# Altium footprint library ICs And Semiconductors THD.PcbLib: 507 footprints (part 23 of 32)
Each footprint in its own frame and in the unit in brackets; x right, y up, seen from the top. Pads: shape width x height; smd on the part's side, far side on the other; paste and mask are expansions set on the pad; w line width, h text height; cw(c..) or ccw(c..) is an arc to the next point about the centre after c.
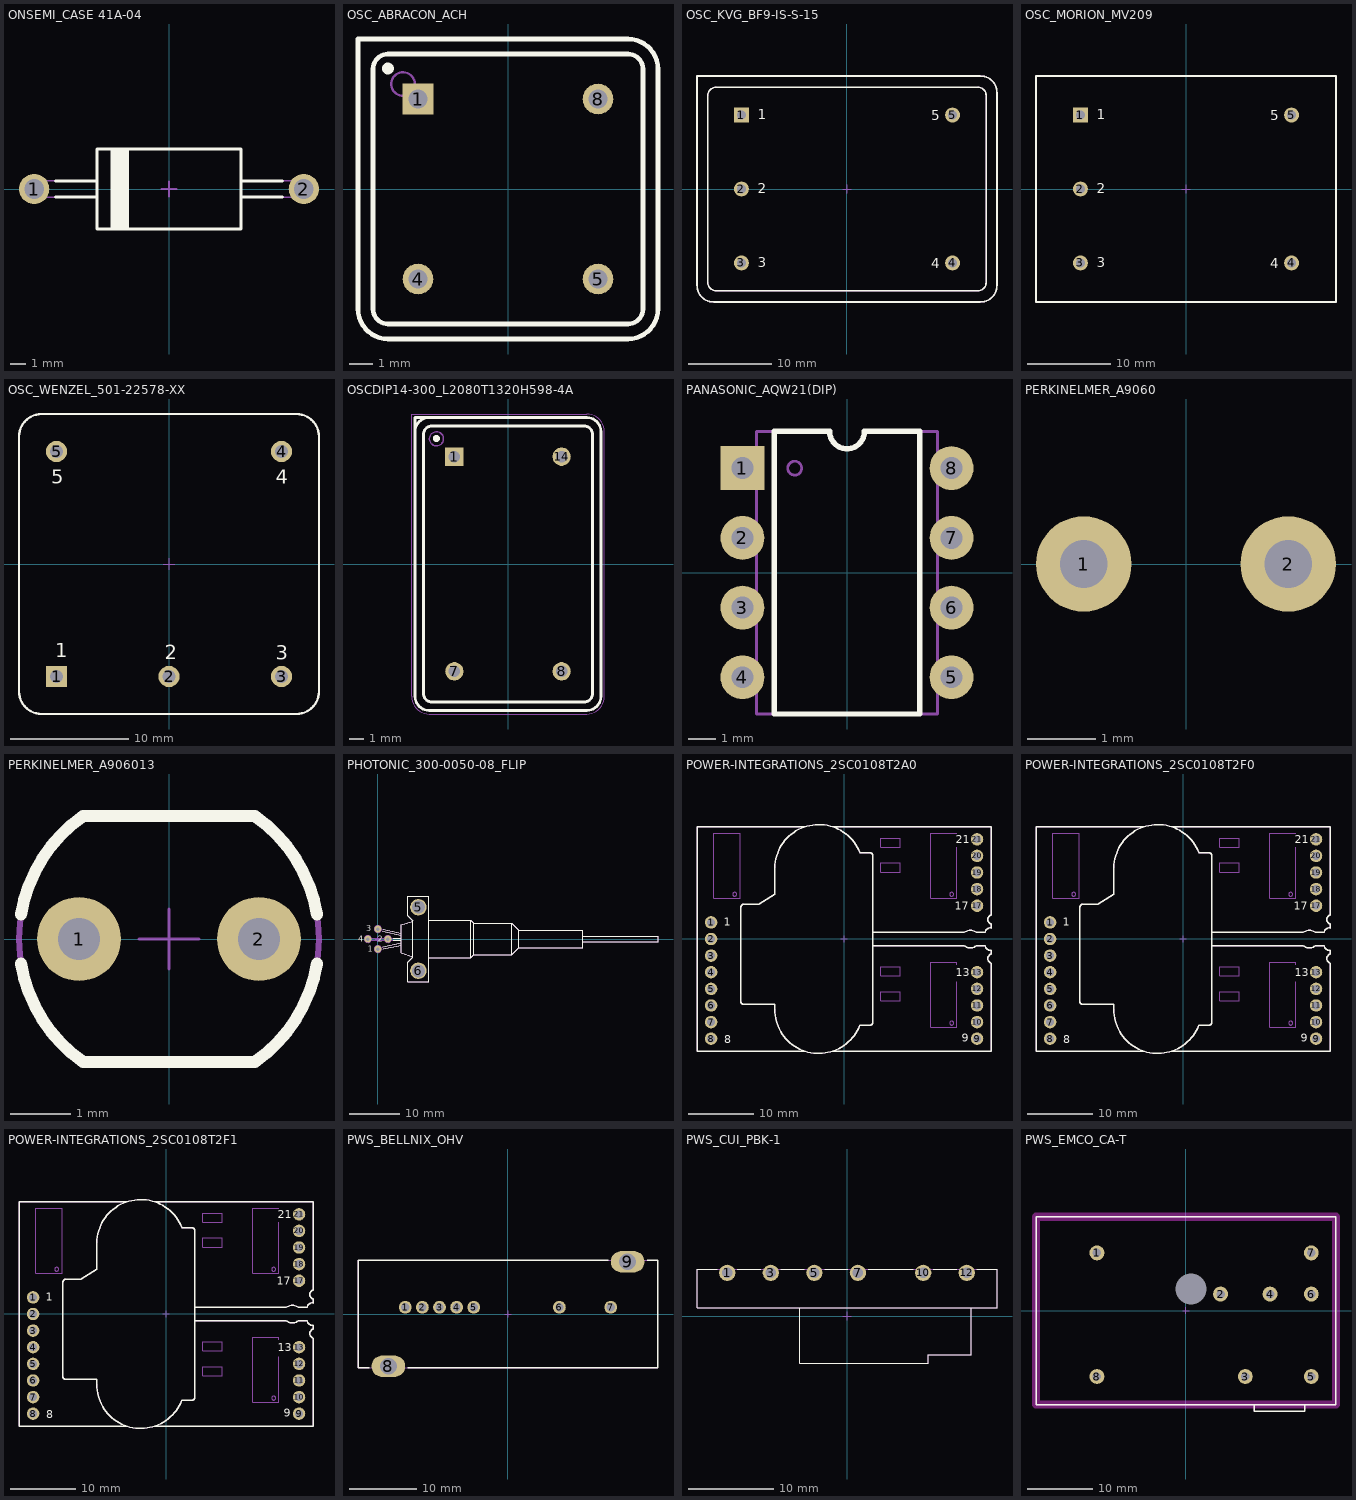
[diagram p22: the footprints below, top view; thin cyan lines are the x and y axes]

## ONSEMI_CASE 41A-04 [mm] "ONSEMICONDUCTOR CASE 41A-04, Diode, Axial; Lead Spacing 15.24mm, Lead Dia. 1.06mm, Body Length 9mm, Body Dia. 5.05mm"
height 3.68
pads (2):
  round 2 hole 1.3: 1(-8.89,0) 2(8.89,0)
Top Overlay:
  lines w0.2: -7.487,-0.53 -4.75,-0.53 ; -7.487,0.53 -4.75,0.53 ; -3.75,-2.65 -3.75,2.65 ; -3.55,-2.65 -3.55,2.65 ; -3.35,-2.65 -3.35,2.65 ; -3.15,-2.65 -3.15,2.65 ; -2.95,-2.65 -2.95,2.65 ; -2.75,-2.65 -2.75,2.65 ; 4.75,-0.53 7.487,-0.53 ; 4.75,0.53 7.487,0.53 ; -4.75,-2.65 -4.75,2.65 4.75,2.65 4.75,-2.65 -4.75,-2.65
Notvisible:
  lines w0.1: -9.39,0 -8.89,0 ; -8.89,-0.5 -8.89,0 ; -8.89,0.5 -8.89,0 ; -8.39,0 -8.89,0 ; -0.5,0 0,0 ; 0,-0.5 0,0 ; 0,0.5 0,0 ; 0.5,0 0,0 ; 8.39,0 8.89,0 ; 8.89,-0.5 8.89,0 ; 8.89,0.5 8.89,0 ; 9.39,0 8.89,0
Mechanical 14:
  lines w0.1: -4.75,-0.53 -8.89,-0.53 cw(c-8.89,0) -8.89,0.53 -4.75,0.53 ; -3.75,-2.65 -3.75,2.65 ; -3.55,-2.65 -3.55,2.65 ; -3.35,-2.65 -3.35,2.65 ; -3.15,-2.65 -3.15,2.65 ; -2.95,-2.65 -2.95,2.65 ; -2.75,-2.65 -2.75,2.65 ; 4.75,-0.53 8.89,-0.53 ccw(c8.89,0) 8.89,0.53 4.75,0.53 ; -4.75,-2.65 -4.75,2.65 4.75,2.65 4.75,-2.65 -4.75,-2.65
3D body "ONSEMI_CASE 41A-04.stp": height 5.3, standoff -3.8, extent -9.42,-2.65 9.42,2.65

## OSC_ABRACON_ACH [mm] "Oscillator DIP8, 4 Leads, Pitch 7.62 mm X 7.62mm; Body 12.7mm X 12.7mm"
height 6.39
pads (4):
  rect 1.3x1.3 hole 0.8: 1(-3.81,3.81)
  round 1.3 hole 0.8: 4(-3.81,-3.81) 5(3.81,-3.81) 8(3.81,3.81)
Top Overlay:
  circle w0.25: c-5.081,5.101 r0.125
  lines w0.2: -6.35,-5.08 ccw(c-5.08,-5.08) -5.08,-6.35 5.08,-6.35 ccw(c5.08,-5.08) 6.35,-5.08 6.35,5.08 ccw(c5.08,5.08) 5.08,6.35 -6.35,6.35 -6.35,-5.08 ; -5.715,-5.08 ccw(c-5.08,-5.08) -5.08,-5.715 5.08,-5.715 ccw(c5.08,-5.08) 5.715,-5.08 5.715,5.08 ccw(c5.08,5.08) 5.08,5.715 -5.08,5.715 ccw(c-5.08,5.08) -5.715,5.08 -5.715,-5.08
Mechanical 14:
  circle w0.1: c-4.445,4.445 r0.5
  lines w0.1: -6.35,-5.08 ccw(c-5.08,-5.08) -5.08,-6.35 5.08,-6.35 ccw(c5.08,-5.08) 6.35,-5.08 6.35,5.08 ccw(c5.08,5.08) 5.08,6.35 -6.35,6.35 -6.35,-5.08 ; -5.715,-5.08 ccw(c-5.08,-5.08) -5.08,-5.715 5.08,-5.715 ccw(c5.08,-5.08) 5.715,-5.08 5.715,5.08 ccw(c5.08,5.08) 5.08,5.715 -5.08,5.715 ccw(c-5.08,5.08) -5.715,5.08 -5.715,-5.08
3D body "OSC_ABRACON_ACH.stp": height 6.39, standoff -3.6, extent -6.35,-6.35 6.35,6.35

## OSC_KVG_BF9-IS-S-15 [mm] "Oscillator, 5 Leads, Body 27.2mm X 36.1mm, KVG Case Style BF9-IS-S-15"
height 15.5
pads (5):
  rect 1.8x1.8 hole 1.1: 1(-12.7,8.9)
  round 1.8 hole 1.1: 2(-12.7,0) 3(-12.7,-8.9) 4(12.7,-8.9) 5(12.7,8.9)
Top Overlay:
  lines w0.2: -18.05,-11.6 ccw(c-16.05,-11.6) -16.05,-13.6 16.05,-13.6 ccw(c16.05,-11.6) 18.05,-11.6 18.05,11.6 ccw(c16.05,11.6) 16.05,13.6 -18.05,13.6 -18.05,-11.6 ; -16.75,-11.25 ccw(c-15.75,-11.25) -15.75,-12.25 15.75,-12.25 ccw(c15.75,-11.25) 16.75,-11.25 16.75,11.25 ccw(c15.75,11.25) 15.75,12.25 -15.75,12.25 ccw(c-15.75,11.25) -16.75,11.25 -16.75,-11.25
  text "1" at -10.725,8.375 h1.2
  text "2" at -10.725,-0.525 h1.2
  text "3" at -10.725,-9.425 h1.2
  text "4" at 10.15,-9.525 h1.2
  text "5" at 10.15,8.275 h1.2
Notvisible:
  lines w0.1: -13.2,-8.9 -12.7,-8.9 ; -13.2,0 -12.7,0 ; -13.2,8.9 -12.7,8.9 ; -12.7,-9.4 -12.7,-8.9 ; -12.7,-8.4 -12.7,-8.9 ; -12.7,-0.5 -12.7,0 ; -12.7,0.5 -12.7,0 ; -12.7,8.4 -12.7,8.9 ; -12.7,9.4 -12.7,8.9 ; -12.2,-8.9 -12.7,-8.9 ; -12.2,0 -12.7,0 ; -12.2,8.9 -12.7,8.9 ; -0.5,0 0,0 ; 0,-0.5 0,0 ; 0,0.5 0,0 ; 0.5,0 0,0 ; 12.2,-8.9 12.7,-8.9 ; 12.2,8.9 12.7,8.9 ; 12.7,-9.4 12.7,-8.9 ; 12.7,-8.4 12.7,-8.9 ; 12.7,8.4 12.7,8.9 ; 12.7,9.4 12.7,8.9 ; 13.2,-8.9 12.7,-8.9 ; 13.2,8.9 12.7,8.9
Mechanical 14:
  lines w0.1: -18.05,-11.6 ccw(c-16.05,-11.6) -16.05,-13.6 16.05,-13.6 ccw(c16.05,-11.6) 18.05,-11.6 18.05,11.6 ccw(c16.05,11.6) 16.05,13.6 -18.05,13.6 -18.05,-11.6 ; -16.75,-11.25 ccw(c-15.75,-11.25) -15.75,-12.25 15.75,-12.25 ccw(c15.75,-11.25) 16.75,-11.25 16.75,11.25 ccw(c15.75,11.25) 15.75,12.25 -15.75,12.25 ccw(c-15.75,11.25) -16.75,11.25 -16.75,-11.25
  text "1" at -10.725,8.375 h1.2
  text "2" at -10.725,-0.525 h1.2
  text "3" at -10.725,-9.425 h1.2
  text "4" at 10.15,-9.525 h1.2
  text "5" at 10.15,8.275 h1.2
3D body "OSC_KVG_BF9-IS-S-15.stp": height 15.5, standoff -3.6, extent -18.05,-13.6 18.05,13.6

## OSC_MORION_MV209 [mm] "Oscillator, 5 Leads, Body 27.2mm X 36.1mm MORION-US Case Style MV209"
height 19
pads (5):
  rect 1.8x1.8 hole 1.1: 1(-12.7,8.9)
  round 1.8 hole 1.1: 2(-12.7,0) 3(-12.7,-8.9) 4(12.7,-8.9) 5(12.7,8.9)
Top Overlay:
  lines w0.2: -18.05,-13.6 18.05,-13.6 18.05,13.6 -18.05,13.6 -18.05,-13.6
  text "1" at -10.725,8.375 h1.2
  text "2" at -10.725,-0.525 h1.2
  text "3" at -10.725,-9.425 h1.2
  text "4" at 10.15,-9.525 h1.2
  text "5" at 10.15,8.275 h1.2
Notvisible:
  lines w0.05: -13.2,-8.9 -12.7,-8.9 ; -13.2,0 -12.7,0 ; -13.2,8.9 -12.7,8.9 ; -12.7,-9.4 -12.7,-8.9 ; -12.7,-8.4 -12.7,-8.9 ; -12.7,-0.5 -12.7,0 ; -12.7,0.5 -12.7,0 ; -12.7,8.4 -12.7,8.9 ; -12.7,9.4 -12.7,8.9 ; -12.2,-8.9 -12.7,-8.9 ; -12.2,0 -12.7,0 ; -12.2,8.9 -12.7,8.9 ; -0.5,0 0,0 ; 0,-0.5 0,0 ; 0,0.5 0,0 ; 0.5,0 0,0 ; 12.2,-8.9 12.7,-8.9 ; 12.2,8.9 12.7,8.9 ; 12.7,-9.4 12.7,-8.9 ; 12.7,-8.4 12.7,-8.9 ; 12.7,8.4 12.7,8.9 ; 12.7,9.4 12.7,8.9 ; 13.2,-8.9 12.7,-8.9 ; 13.2,8.9 12.7,8.9
Mechanical 14:
  lines w0.1: -18.05,-13.6 18.05,-13.6 18.05,13.6 -18.05,13.6 -18.05,-13.6
  text "1" at -10.725,8.375 h1.2
  text "2" at -10.725,-0.525 h1.2
  text "3" at -10.725,-9.425 h1.2
  text "4" at 10.15,-9.525 h1.2
  text "5" at 10.15,8.275 h1.2
3D body "OSC_MORION_MV209.stp": height 19, standoff -3.6, extent -18.05,-13.6 18.05,13.6

## OSC_WENZEL_501-22578-XX [mm] "Onyx IV Crystal Oscillator, 5 Leads, Body 25.4mm X 25.4mm"
height 19
pads (5):
  rect 1.8x1.8 hole 1.1: 1(-9.525,-9.525)
  round 1.8 hole 1.1: 2(0,-9.525) 3(9.525,-9.525) 4(9.525,9.525) 5(-9.525,9.525)
Top Overlay:
  lines w0.2: -12.7,-10.795 ccw(c-10.795,-10.795) -10.795,-12.7 10.795,-12.7 ccw(c10.795,-10.795) 12.7,-10.795 12.7,10.795 ccw(c10.795,10.795) 10.795,12.7 -10.795,12.7 ccw(c-10.795,10.795) -12.7,10.795 -12.7,-10.795
  text "5" at -9.95,6.8 h1.2
  text "4" at 9.05,6.8 h1.2
  text "3" at 9.025,-8.1 h1.2
  text "2" at -0.35,-8.075 h1.2
  text "1" at -9.625,-7.875 h1.2
Notvisible:
  lines w0.1: -10.025,-9.525 -9.525,-9.525 ; -10.025,9.525 -9.525,9.525 ; -9.525,-10.025 -9.525,-9.525 ; -9.525,-9.025 -9.525,-9.525 ; -9.525,9.025 -9.525,9.525 ; -9.525,10.025 -9.525,9.525 ; -9.025,-9.525 -9.525,-9.525 ; -9.025,9.525 -9.525,9.525 ; -0.5,0 0,0 ; 0,-0.5 0,0 ; 0,0.5 0,0 ; 0.5,0 0,0 ; 9.025,-9.525 9.525,-9.525 ; 9.025,9.525 9.525,9.525 ; 9.525,-10.025 9.525,-9.525 ; 9.525,-9.025 9.525,-9.525 ; 9.525,9.025 9.525,9.525 ; 9.525,10.025 9.525,9.525 ; 10.025,-9.525 9.525,-9.525 ; 10.025,9.525 9.525,9.525 ; 0,-9.525 -0.5,-9.525 0,-9.525 ; 0,-9.525 0,-9.025 0,-9.525 ; 0,-9.525 0,-10.025 0,-9.525 ; 0,-9.525 0.5,-9.525 0,-9.525
Mechanical 14:
  lines w0.1: -12.7,-10.795 ccw(c-10.795,-10.795) -10.795,-12.7 10.795,-12.7 ccw(c10.795,-10.795) 12.7,-10.795 12.7,10.795 ccw(c10.795,10.795) 10.795,12.7 -10.795,12.7 ccw(c-10.795,10.795) -12.7,10.795 -12.7,-10.795
  text "5" at -9.95,6.8 h1.2
  text "4" at 9.05,6.8 h1.2
  text "3" at 9.025,-8.1 h1.2
  text "2" at -0.35,-8.075 h1.2
  text "1" at -9.625,-7.875 h1.2
3D body "OSC_WENZEL_501-22578-XX.stp": height 13.08, standoff -3.17, extent -12.7,-12.7 12.7,12.7

## OSCDIP14-300_L2080T1320H598-4A [mm] "Oscillator DIP 14 Leads, Row Spacing 7.62 mm; Pitch 2.54mm"
height 5.98
pads (4):
  rect 1.3x1.3 hole 0.8: 1(-3.81,7.62)
  round 1.3 hole 0.8: 7(-3.81,-7.62) 8(3.81,-7.62) 14(3.81,7.62)
Top Overlay:
  circle w0.25: c-5.081,8.911 r0.125
  lines w0.2: -6.6,9.4 cw(c-5.6,9.4) -5.6,10.4 ; -6.6,-9.4 ccw(c-5.6,-9.4) -5.6,-10.4 5.6,-10.4 ccw(c5.6,-9.4) 6.6,-9.4 6.6,9.4 ccw(c5.6,9.4) 5.6,10.4 -6.6,10.4 -6.6,-9.4 ; -6,-9.2 ccw(c-5.4,-9.2) -5.4,-9.8 5.4,-9.8 ccw(c5.4,-9.2) 6,-9.2 6,9.2 ccw(c5.4,9.2) 5.4,9.8 -5.4,9.8 ccw(c-5.4,9.2) -6,9.2 -6,-9.2
Mechanical 14:
  circle w0.1: c-5.08,8.89 r0.5
  lines w0.1: -6.6,9.4 cw(c-5.6,9.4) -5.6,10.4 ; -6.6,-9.4 ccw(c-5.6,-9.4) -5.6,-10.4 5.6,-10.4 ccw(c5.6,-9.4) 6.6,-9.4 6.6,9.4 ccw(c5.6,9.4) 5.6,10.4 -6.6,10.4 -6.6,-9.4 ; -6,-9.2 ccw(c-5.4,-9.2) -5.4,-9.8 5.4,-9.8 ccw(c5.4,-9.2) 6,-9.2 6,9.2 ccw(c5.4,9.2) 5.4,9.8 -5.4,9.8 ccw(c-5.4,9.2) -6,9.2 -6,-9.2
Mechanical 15:
  lines w0.05: -6.85,-9.4 ccw(c-5.6,-9.4) -5.6,-10.65 5.6,-10.65 ccw(c5.6,-9.4) 6.85,-9.4 6.85,9.4 ccw(c5.6,9.4) 5.6,10.65 -6.85,10.65 -6.85,-9.4
3D body "OSCDIP14-300_L2080T1320H598-4A.stp": height 5.98, standoff -3.6, extent -6.6,-10.4 6.6,10.4

## PANASONIC_AQW21(DIP) [mm] "DIP 8 Leads, Row Spacing 7.62 mm; Pitch 2.54 mm"
height 5.08
pads (8):
  rect 1.6x1.6 hole 0.8: 1(-3.81,3.81)
  round 1.6 hole 0.8: 2(-3.81,1.27) 3(-3.81,-1.27) 4(-3.81,-3.81) 5(3.81,-3.81) 6(3.81,-1.27) 7(3.81,1.27) 8(3.81,3.81)
Top Overlay:
  lines w0.2: -0.635,5.15 ccw(c0,5.15) 0.635,5.15 ; -0.635,5.15 ccw(c0,5.15) 0.635,5.15 ; -0.635,5.15 -2.65,5.15 -2.65,-5.15 2.65,-5.15 2.65,5.15 0.635,5.15
Mechanical 14:
  circle w0.1: c-1.905,3.81 r0.254
  lines w0.1: -3.3,-5.15 -3.3,5.15 -0.635,5.15 ccw(c0,5.15) 0.635,5.15 3.3,5.15 3.3,-5.15 -3.3,-5.15
3D body "PANASONIC_AQW21(DIP).stp": height 3.4, standoff -3, extent -3.91,-4.93 3.91,4.93

## PERKINELMER_A9060 [mm] "Ambient Light Sensing Photocell D 5mm H 5.5mm"
height 5.5
pads (2):
  round 1.4 hole 0.7: 1(-1.5,0) 2(1.5,0)

## PERKINELMER_A906013 [mm] "Ambient Light Sensing Photocell D 5mm H 5.5mm"
height 5.6
pads (2):
  round 1.4 hole 0.7: 1(-1.5,0) 2(1.5,0)
Top Overlay:
  lines w0.2: -2.466,-0.412 ccw(c0,0) -1.431,-2.05 1.431,-2.05 ccw(c0,0) 2.466,-0.412 ; -2.466,0.412 cw(c0,0) -1.431,2.05 1.431,2.05 cw(c0,0) 2.466,0.412
Notvisible:
  lines w0.05: -2,0 -1.5,0 ; -1.5,-0.5 -1.5,0 ; -1.5,0.5 -1.5,0 ; -1,0 -1.5,0 ; -0.5,0 0,0 ; 0,-0.5 0,0 ; 0,0.5 0,0 ; 0.5,0 0,0 ; 1,0 1.5,0 ; 1.5,-0.5 1.5,0 ; 1.5,0.5 1.5,0 ; 2,0 1.5,0
Mechanical 14:
  lines w0.1: -1.431,-2.05 cw(c0,0) -1.431,2.05 1.431,2.05 cw(c0,0) 1.431,-2.05 -1.431,-2.05
3D body "PERKINELMER_A9060.stp": height 5.6, standoff -3.6, extent -2.5,-2.05 2.5,2.05

## PHOTONIC_300-0050-08_FLIP [mm] "1310nm DFB Pigtailed Laser Diode"
height 8
pads (6):
  round 1.4 hole 0.7: 1(0,-2) 2(2,0) 3(0,2) 4(-2,0)
  round 3.3 hole 2.6: 5(8.1,6.352) 6(8.1,-6.348)
Top Overlay:
  lines w0.2: 0.966,-1.59 4.7,-0.794 ; 0.969,1.595 4.7,0.796 ; 1.05,1.973 4.7,1.195 ; 1.05,-1.981 4.7,-1.203 ; 3.031,-0.2 4.7,-0.2 ; 3.031,0.2 4.7,0.2 ; 7,-3.498 4.7,-2.748 4.7,2.802 7,3.502 ; 41,-0.498 56,-0.498 56,0.502 41,0.502 ; 10.2,-3.748 10.2,3.752 ; 10.2,-3.748 10.2,-8.498 6,-8.498 6,-4.598 7,-3.598 7,3.602 6,4.602 6,8.502 10.2,8.502 10.2,3.752 ; 10.2,-3.748 18.6,-3.748 ; 10.2,3.752 18.6,3.752 ; 18.6,-3.748 18.6,3.752 ; 18.6,-3.748 19.2,-3.148 ; 18.6,3.752 19.2,3.152 ; 19.2,-3.148 19.2,3.152 ; 19.2,-3.148 26.8,-3.148 ; 19.2,3.152 26.8,3.152 ; 26.8,-3.148 26.8,3.152 ; 26.8,-3.148 28.2,-1.748 ; 26.8,3.152 28.2,1.752 ; 28.2,-1.748 28.2,1.752 ; 28.2,-1.748 41,-1.748 41,1.752 28.2,1.752
  text "2" at 0,-0.5 h1.2
  text "4" at -3.975,-0.5 h1.2
  text "3" at -2.35,1.575 h1.2
  text "1" at -2.05,-2.575 h1.2
Notvisible:
  circle w0.1: c0,-2 r0.7
  circle w0.1: c-2,0 r0.7
  circle w0.1: c0,2 r0.7
  circle w0.1: c2,0 r0.7
  circle w0.1: c-2,0 r0.35
  lines w0.1: -2.5,0 -2,0 ; -2,-0.5 -2,0 ; -2,0.5 -2,0 ; -1.5,0 -2,0 ; -0.5,-2 0,-2 ; -0.5,0 0,0 ; -0.5,2 0,2 ; 0,-2.5 0,-2 ; 0,-1.5 0,-2 ; 0,-0.5 0,0 ; 0,0.5 0,0 ; 0,1.5 0,2 ; 0,2.5 0,2 ; 0.5,-2 0,-2 ; 0.5,0 0,0 ; 0.5,2 0,2 ; 1.5,0 2,0 ; 2,-0.5 2,0 ; 2,0.5 2,0 ; 2.5,0 2,0 ; 7.6,-6.348 8.1,-6.348 ; 7.6,6.352 8.1,6.352 ; 8.1,-6.848 8.1,-6.348 ; 8.1,-5.848 8.1,-6.348 ; 8.1,5.852 8.1,6.352 ; 8.1,6.852 8.1,6.352 ; 8.6,-6.348 8.1,-6.348 ; 8.6,6.352 8.1,6.352
Mechanical 14:
  circle w0.1: c8.1,6.352 r1.25
  circle w0.1: c8.1,-6.348 r1.25
  lines w0.1: 4.7,-1.203 0.042,-2.196 cw(c0,-2) -0.042,-1.804 4.7,-0.794 ; 4.7,-0.2 -2,-0.2 cw(c-2,0) -2,0.2 4.7,0.2 ; 4.7,0.796 -0.04,1.811 cw(c0,1.999) 0.04,2.188 4.7,1.195 ; 7,-3.498 4.7,-2.748 4.7,2.802 7,3.502 ; 41,-0.498 56,-0.498 56,0.502 41,0.502 ; 10.2,-3.748 10.2,-8.498 6,-8.498 6,-4.598 7,-3.598 7,3.602 6,4.602 6,8.502 10.2,8.502 10.2,3.752 ; 10.2,-3.748 18.6,-3.748 ; 10.2,-3.748 10.2,3.752 ; 10.2,3.752 18.6,3.752 ; 18.6,-3.748 19.2,-3.148 ; 18.6,-3.748 18.6,3.752 ; 18.6,3.752 19.2,3.152 ; 19.2,-3.148 26.8,-3.148 ; 19.2,-3.148 19.2,3.152 ; 19.2,3.152 26.8,3.152 ; 26.8,-3.148 28.2,-1.748 ; 26.8,-3.148 26.8,3.152 ; 26.8,3.152 28.2,1.752 ; 28.2,-1.748 41,-1.748 41,1.752 28.2,1.752 ; 28.2,-1.748 28.2,1.752
3D body "PHOTONIC_300-0050-08_flip.stp": height 8, standoff -2.5, extent -2.198,-8.498 56,8.502

## POWER-INTEGRATIONS_2SC0108T2A0 [mm] "Dual-Channel SCALE™-2 Driver Core, Body 45x34.29mm (Pin 2.54mm)"
height 16
pads (18):
  round 1.9 hole 1.2: 1(-20.325,2.54) 2(-20.325,0) 3(-20.325,-2.54) 4(-20.325,-5.08) 5(-20.325,-7.62) 6(-20.325,-10.16) 7(-20.325,-12.7) 8(-20.325,-15.24) 9(20.32,-15.24) 10(20.32,-12.7) 11(20.32,-10.16) 12(20.32,-7.62) 13(20.32,-5.08) 17(20.32,5.08) 18(20.32,7.62) 19(20.32,10.16) 20(20.32,12.7) 21(20.32,15.24)
Top Overlay:
  lines w0.2: -5.998,-17.145 -22.479,-17.145 -22.479,17.145 -5.989,17.145 ; -1.741,17.145 22.479,17.145 22.479,3.663 ccw(c22.665,2.984) 22.479,2.305 22.479,1.663 ccw(c22.287,0.987) 21.585,1.002 20.216,1.002 ccw(c19.304,-0.019) 18.392,1.002 4.395,1.002 ; -1.732,-17.145 22.479,-17.145 22.479,-3.683 cw(c22.665,-3.004) 22.479,-2.325 22.479,-1.683 cw(c22.288,-1.005) 21.584,-0.999 20.219,-0.999 cw(c19.304,-0.024) 18.389,-0.999 4.395,-1 ; 2.398,13.199 3.895,13.199 cw(c3.895,12.699) 4.395,12.699 4.395,-12.701 cw(c3.895,-12.701) 3.895,-13.201 2.414,-13.201 cw(c-3.865,-10.751) -10.605,-10.751 -10.605,-10.001 -15.305,-10.001 cw(c-15.305,-9.501) -15.805,-9.501 -15.805,4.799 cw(c-15.305,4.799) -15.305,5.299 -13.005,5.299 -13.005,5.3 -10.616,6.812 -10.608,6.812 -10.603,6.815 -10.603,10.924 cw(c-3.865,10.749) 2.398,13.24
  text "21" at 17.1,14.6 h1.2
  text "17" at 16.935,4.5 h1.2
  text "13" at 17.1,-5.7 h1.2
  text "9" at 17.989,-15.74 h1.2
  text "8" at -18.3,-15.9 h1.2
  text "1" at -18.4,2 h1.2
Notvisible:
  lines w0.1: -20.825,-15.24 -20.325,-15.24 ; -20.825,-12.7 -20.325,-12.7 ; -20.825,-10.16 -20.325,-10.16 ; -20.825,-7.62 -20.325,-7.62 ; -20.825,-5.08 -20.325,-5.08 ; -20.825,-2.54 -20.325,-2.54 ; -20.825,0 -20.325,0 ; -20.825,2.54 -20.325,2.54 ; -20.325,-15.74 -20.325,-15.24 ; -20.325,-14.74 -20.325,-15.24 ; -20.325,-13.2 -20.325,-12.7 ; -20.325,-12.2 -20.325,-12.7 ; -20.325,-10.66 -20.325,-10.16 ; -20.325,-9.66 -20.325,-10.16 ; -20.325,-8.12 -20.325,-7.62 ; -20.325,-7.12 -20.325,-7.62 ; -20.325,-5.58 -20.325,-5.08 ; -20.325,-4.58 -20.325,-5.08 ; -20.325,-3.04 -20.325,-2.54 ; -20.325,-2.04 -20.325,-2.54 ; -20.325,-0.5 -20.325,0 ; -20.325,0.5 -20.325,0 ; -20.325,2.04 -20.325,2.54 ; -20.325,3.04 -20.325,2.54 ; -19.825,-15.24 -20.325,-15.24 ; -19.825,-12.7 -20.325,-12.7 ; -19.825,-10.16 -20.325,-10.16 ; -19.825,-7.62 -20.325,-7.62 ; -19.825,-5.08 -20.325,-5.08 ; -19.825,-2.54 -20.325,-2.54 ; -19.825,0 -20.325,0 ; -19.825,2.54 -20.325,2.54 ; -0.5,0 0,0 ; 0,-0.5 0,0 ; 0,0.5 0,0 ; 0.5,0 0,0 ; 19.82,-15.24 20.32,-15.24 ; 19.82,-12.7 20.32,-12.7 ; 19.82,-10.16 20.32,-10.16 ; 19.82,-7.62 20.32,-7.62 ; 19.82,-5.08 20.32,-5.08 ; 19.82,5.08 20.32,5.08 ; 19.82,7.62 20.32,7.62 ; 19.82,10.16 20.32,10.16 ; 19.82,12.7 20.32,12.7 ; 19.82,15.24 20.32,15.24 ; 20.32,-15.74 20.32,-15.24 ; 20.32,-14.74 20.32,-15.24 ; 20.32,-13.2 20.32,-12.7 ; 20.32,-12.2 20.32,-12.7 ; 20.32,-10.66 20.32,-10.16 ; 20.32,-9.66 20.32,-10.16 ; 20.32,-8.12 20.32,-7.62 ; 20.32,-7.12 20.32,-7.62 ; 20.32,-5.58 20.32,-5.08 ; 20.32,-4.58 20.32,-5.08 ; 20.32,4.58 20.32,5.08 ; 20.32,5.58 20.32,5.08 ; 20.32,7.12 20.32,7.62 ; 20.32,8.12 20.32,7.62 ; 20.32,9.66 20.32,10.16 ; 20.32,10.66 20.32,10.16 ; 20.32,12.2 20.32,12.7 ; 20.32,13.2 20.32,12.7 ; 20.32,14.74 20.32,15.24 ; 20.32,15.74 20.32,15.24 ; 20.82,-15.24 20.32,-15.24 ; 20.82,-12.7 20.32,-12.7 ; 20.82,-10.16 20.32,-10.16 ; 20.82,-7.62 20.32,-7.62 ; 20.82,-5.08 20.32,-5.08 ; 20.82,5.08 20.32,5.08 ; 20.82,7.62 20.32,7.62 ; 20.82,10.16 20.32,10.16 ; 20.82,12.7 20.32,12.7 ; 20.82,15.24 20.32,15.24
Mechanical 14:
  drawing of 286 lines, arcs and shapes, not listed
  text "21" at 17.1,14.6 h1.2
  text "17" at 16.935,4.5 h1.2
  text "13" at 17.1,-5.7 h1.2
  text "9" at 17.989,-15.74 h1.2
  text "8" at -18.3,-15.9 h1.2
  text "1" at -18.4,2 h1.2
3D body "POWER-INTEGRATIONS_2SC0108T2A0.stp": height 15.86, standoff -2.54, extent -22.479,-17.486 22.479,17.479

## POWER-INTEGRATIONS_2SC0108T2F0 [mm] "Dual-Channel SCALE™-2 Driver Core, Body 45x34.29mm (5.84mm)"
height 16
pads (18):
  round 1.9 hole 1.2: 1(-20.325,2.54) 2(-20.325,0) 3(-20.325,-2.54) 4(-20.325,-5.08) 5(-20.325,-7.62) 6(-20.325,-10.16) 7(-20.325,-12.7) 8(-20.325,-15.24) 9(20.32,-15.24) 10(20.32,-12.7) 11(20.32,-10.16) 12(20.32,-7.62) 13(20.32,-5.08) 17(20.32,5.08) 18(20.32,7.62) 19(20.32,10.16) 20(20.32,12.7) 21(20.32,15.24)
Top Overlay:
  lines w0.2: -5.998,-17.145 -22.479,-17.145 -22.479,17.145 -5.989,17.145 ; -1.741,17.145 22.479,17.145 22.479,3.663 ccw(c22.665,2.984) 22.479,2.305 22.479,1.663 ccw(c22.287,0.987) 21.585,1.002 20.216,1.002 ccw(c19.304,-0.019) 18.392,1.002 4.395,1.002 ; -1.732,-17.145 22.479,-17.145 22.479,-3.683 cw(c22.665,-3.004) 22.479,-2.325 22.479,-1.683 cw(c22.288,-1.005) 21.584,-0.999 20.219,-0.999 cw(c19.304,-0.024) 18.389,-0.999 4.395,-1 ; 2.398,13.199 3.895,13.199 cw(c3.895,12.699) 4.395,12.699 4.395,-12.701 cw(c3.895,-12.701) 3.895,-13.201 2.414,-13.201 cw(c-3.865,-10.751) -10.605,-10.751 -10.605,-10.001 -15.305,-10.001 cw(c-15.305,-9.501) -15.805,-9.501 -15.805,4.799 cw(c-15.305,4.799) -15.305,5.299 -13.005,5.299 -13.005,5.3 -10.616,6.812 -10.608,6.812 -10.603,6.815 -10.603,10.924 cw(c-3.865,10.749) 2.398,13.24
  text "21" at 17.1,14.6 h1.2
  text "17" at 16.935,4.5 h1.2
  text "13" at 17.1,-5.7 h1.2
  text "9" at 17.989,-15.74 h1.2
  text "8" at -18.3,-15.9 h1.2
  text "1" at -18.4,2 h1.2
Notvisible:
  lines w0.1: -20.825,-15.24 -20.325,-15.24 ; -20.825,-12.7 -20.325,-12.7 ; -20.825,-10.16 -20.325,-10.16 ; -20.825,-7.62 -20.325,-7.62 ; -20.825,-5.08 -20.325,-5.08 ; -20.825,-2.54 -20.325,-2.54 ; -20.825,0 -20.325,0 ; -20.825,2.54 -20.325,2.54 ; -20.325,-15.74 -20.325,-15.24 ; -20.325,-14.74 -20.325,-15.24 ; -20.325,-13.2 -20.325,-12.7 ; -20.325,-12.2 -20.325,-12.7 ; -20.325,-10.66 -20.325,-10.16 ; -20.325,-9.66 -20.325,-10.16 ; -20.325,-8.12 -20.325,-7.62 ; -20.325,-7.12 -20.325,-7.62 ; -20.325,-5.58 -20.325,-5.08 ; -20.325,-4.58 -20.325,-5.08 ; -20.325,-3.04 -20.325,-2.54 ; -20.325,-2.04 -20.325,-2.54 ; -20.325,-0.5 -20.325,0 ; -20.325,0.5 -20.325,0 ; -20.325,2.04 -20.325,2.54 ; -20.325,3.04 -20.325,2.54 ; -19.825,-15.24 -20.325,-15.24 ; -19.825,-12.7 -20.325,-12.7 ; -19.825,-10.16 -20.325,-10.16 ; -19.825,-7.62 -20.325,-7.62 ; -19.825,-5.08 -20.325,-5.08 ; -19.825,-2.54 -20.325,-2.54 ; -19.825,0 -20.325,0 ; -19.825,2.54 -20.325,2.54 ; -0.5,0 0,0 ; 0,-0.5 0,0 ; 0,0.5 0,0 ; 0.5,0 0,0 ; 19.82,-15.24 20.32,-15.24 ; 19.82,-12.7 20.32,-12.7 ; 19.82,-10.16 20.32,-10.16 ; 19.82,-7.62 20.32,-7.62 ; 19.82,-5.08 20.32,-5.08 ; 19.82,5.08 20.32,5.08 ; 19.82,7.62 20.32,7.62 ; 19.82,10.16 20.32,10.16 ; 19.82,12.7 20.32,12.7 ; 19.82,15.24 20.32,15.24 ; 20.32,-15.74 20.32,-15.24 ; 20.32,-14.74 20.32,-15.24 ; 20.32,-13.2 20.32,-12.7 ; 20.32,-12.2 20.32,-12.7 ; 20.32,-10.66 20.32,-10.16 ; 20.32,-9.66 20.32,-10.16 ; 20.32,-8.12 20.32,-7.62 ; 20.32,-7.12 20.32,-7.62 ; 20.32,-5.58 20.32,-5.08 ; 20.32,-4.58 20.32,-5.08 ; 20.32,4.58 20.32,5.08 ; 20.32,5.58 20.32,5.08 ; 20.32,7.12 20.32,7.62 ; 20.32,8.12 20.32,7.62 ; 20.32,9.66 20.32,10.16 ; 20.32,10.66 20.32,10.16 ; 20.32,12.2 20.32,12.7 ; 20.32,13.2 20.32,12.7 ; 20.32,14.74 20.32,15.24 ; 20.32,15.74 20.32,15.24 ; 20.82,-15.24 20.32,-15.24 ; 20.82,-12.7 20.32,-12.7 ; 20.82,-10.16 20.32,-10.16 ; 20.82,-7.62 20.32,-7.62 ; 20.82,-5.08 20.32,-5.08 ; 20.82,5.08 20.32,5.08 ; 20.82,7.62 20.32,7.62 ; 20.82,10.16 20.32,10.16 ; 20.82,12.7 20.32,12.7 ; 20.82,15.24 20.32,15.24
Mechanical 14:
  drawing of 286 lines, arcs and shapes, not listed
  text "21" at 17.1,14.6 h1.2
  text "17" at 16.935,4.5 h1.2
  text "13" at 17.1,-5.7 h1.2
  text "9" at 17.989,-15.74 h1.2
  text "8" at -18.3,-15.9 h1.2
  text "1" at -18.4,2 h1.2
3D body "POWER-INTEGRATIONS_2SC0108T2F0.stp": height 15.86, standoff -5.84, extent -22.479,-17.49 22.479,17.489

## POWER-INTEGRATIONS_2SC0108T2F1 [mm] "Dual-Channel SCALE™-2 Driver Core, Body 45x34.29mm (5.84mm)"
height 16
pads (18):
  round 1.9 hole 1.2: 1(-20.325,2.54) 2(-20.325,0) 3(-20.325,-2.54) 4(-20.325,-5.08) 5(-20.325,-7.62) 6(-20.325,-10.16) 7(-20.325,-12.7) 8(-20.325,-15.24) 9(20.32,-15.24) 10(20.32,-12.7) 11(20.32,-10.16) 12(20.32,-7.62) 13(20.32,-5.08) 17(20.32,5.08) 18(20.32,7.62) 19(20.32,10.16) 20(20.32,12.7) 21(20.32,15.24)
Top Overlay:
  lines w0.2: -5.998,-17.145 -22.479,-17.145 -22.479,17.145 -5.989,17.145 ; -1.741,17.145 22.479,17.145 22.479,3.663 ccw(c22.665,2.984) 22.479,2.305 22.479,1.663 ccw(c22.287,0.987) 21.585,1.002 20.216,1.002 ccw(c19.304,-0.019) 18.392,1.002 4.395,1.002 ; -1.732,-17.145 22.479,-17.145 22.479,-3.683 cw(c22.665,-3.004) 22.479,-2.325 22.479,-1.683 cw(c22.288,-1.005) 21.584,-0.999 20.219,-0.999 cw(c19.304,-0.024) 18.389,-0.999 4.395,-1 ; 2.398,13.199 3.895,13.199 cw(c3.895,12.699) 4.395,12.699 4.395,-12.701 cw(c3.895,-12.701) 3.895,-13.201 2.414,-13.201 cw(c-3.865,-10.751) -10.605,-10.751 -10.605,-10.001 -15.305,-10.001 cw(c-15.305,-9.501) -15.805,-9.501 -15.805,4.799 cw(c-15.305,4.799) -15.305,5.299 -13.005,5.299 -13.005,5.3 -10.616,6.812 -10.608,6.812 -10.603,6.815 -10.603,10.924 cw(c-3.865,10.749) 2.398,13.24
  text "1" at -18.4,2 h1.2
  text "8" at -18.3,-15.9 h1.2
  text "9" at 17.989,-15.74 h1.2
  text "13" at 17.1,-5.7 h1.2
  text "17" at 16.935,4.5 h1.2
  text "21" at 17.1,14.6 h1.2
Notvisible:
  lines w0.1: -20.825,-15.24 -20.325,-15.24 ; -20.825,-12.7 -20.325,-12.7 ; -20.825,-10.16 -20.325,-10.16 ; -20.825,-7.62 -20.325,-7.62 ; -20.825,-5.08 -20.325,-5.08 ; -20.825,-2.54 -20.325,-2.54 ; -20.825,0 -20.325,0 ; -20.825,2.54 -20.325,2.54 ; -20.325,-15.74 -20.325,-15.24 ; -20.325,-14.74 -20.325,-15.24 ; -20.325,-13.2 -20.325,-12.7 ; -20.325,-12.2 -20.325,-12.7 ; -20.325,-10.66 -20.325,-10.16 ; -20.325,-9.66 -20.325,-10.16 ; -20.325,-8.12 -20.325,-7.62 ; -20.325,-7.12 -20.325,-7.62 ; -20.325,-5.58 -20.325,-5.08 ; -20.325,-4.58 -20.325,-5.08 ; -20.325,-3.04 -20.325,-2.54 ; -20.325,-2.04 -20.325,-2.54 ; -20.325,-0.5 -20.325,0 ; -20.325,0.5 -20.325,0 ; -20.325,2.04 -20.325,2.54 ; -20.325,3.04 -20.325,2.54 ; -19.825,-15.24 -20.325,-15.24 ; -19.825,-12.7 -20.325,-12.7 ; -19.825,-10.16 -20.325,-10.16 ; -19.825,-7.62 -20.325,-7.62 ; -19.825,-5.08 -20.325,-5.08 ; -19.825,-2.54 -20.325,-2.54 ; -19.825,0 -20.325,0 ; -19.825,2.54 -20.325,2.54 ; -0.5,0 0,0 ; 0,-0.5 0,0 ; 0,0.5 0,0 ; 0.5,0 0,0 ; 19.82,-15.24 20.32,-15.24 ; 19.82,-12.7 20.32,-12.7 ; 19.82,-10.16 20.32,-10.16 ; 19.82,-7.62 20.32,-7.62 ; 19.82,-5.08 20.32,-5.08 ; 19.82,5.08 20.32,5.08 ; 19.82,7.62 20.32,7.62 ; 19.82,10.16 20.32,10.16 ; 19.82,12.7 20.32,12.7 ; 19.82,15.24 20.32,15.24 ; 20.32,-15.74 20.32,-15.24 ; 20.32,-14.74 20.32,-15.24 ; 20.32,-13.2 20.32,-12.7 ; 20.32,-12.2 20.32,-12.7 ; 20.32,-10.66 20.32,-10.16 ; 20.32,-9.66 20.32,-10.16 ; 20.32,-8.12 20.32,-7.62 ; 20.32,-7.12 20.32,-7.62 ; 20.32,-5.58 20.32,-5.08 ; 20.32,-4.58 20.32,-5.08 ; 20.32,4.58 20.32,5.08 ; 20.32,5.58 20.32,5.08 ; 20.32,7.12 20.32,7.62 ; 20.32,8.12 20.32,7.62 ; 20.32,9.66 20.32,10.16 ; 20.32,10.66 20.32,10.16 ; 20.32,12.2 20.32,12.7 ; 20.32,13.2 20.32,12.7 ; 20.32,14.74 20.32,15.24 ; 20.32,15.74 20.32,15.24 ; 20.82,-15.24 20.32,-15.24 ; 20.82,-12.7 20.32,-12.7 ; 20.82,-10.16 20.32,-10.16 ; 20.82,-7.62 20.32,-7.62 ; 20.82,-5.08 20.32,-5.08 ; 20.82,5.08 20.32,5.08 ; 20.82,7.62 20.32,7.62 ; 20.82,10.16 20.32,10.16 ; 20.82,12.7 20.32,12.7 ; 20.82,15.24 20.32,15.24
Mechanical 14:
  drawing of 286 lines, arcs and shapes, not listed
  text "1" at -18.4,2 h1.2
  text "8" at -18.3,-15.9 h1.2
  text "9" at 17.989,-15.74 h1.2
  text "13" at 17.1,-5.7 h1.2
  text "17" at 16.935,4.5 h1.2
  text "21" at 17.1,14.6 h1.2
3D body "POWER-INTEGRATIONS_2SC0108T2F1.stp": height 15.86, standoff -5.84, extent -22.479,-17.49 22.479,17.489

## PWS_BELLNIX_OHV [mm] "BELLNIX OHV Series, Ultracompact, Adjustable Output High-Voltage Power Supply , Body 44x16mm"
height 30
pads (9):
  round 1.9 hole 1.2: 1(-15.24,1) 2(-12.7,1) 3(-10.16,1) 4(-7.62,1) 5(-5.08,1) 6(7.62,1) 7(15.24,1)
  oval 5x3.2 hole 2.5: 8(-17.75,-7.75) 9(17.75,7.75)
Top Overlay:
  lines w0.2: -20.6,-8 -22.25,-8 -22.25,8 14.863,8 ; -14.86,-8 22.25,-8 22.25,8 20.63,8
Notvisible:
  lines w0.1: -18.25,-7.75 -17.75,-7.75 ; -17.75,-8.25 -17.75,-7.75 ; -17.75,-7.25 -17.75,-7.75 ; -17.25,-7.75 -17.75,-7.75 ; -15.74,1 -15.24,1 ; -15.24,0.5 -15.24,1 ; -15.24,1.5 -15.24,1 ; -14.74,1 -15.24,1 ; -13.2,1 -12.7,1 ; -12.7,0.5 -12.7,1 ; -12.7,1.5 -12.7,1 ; -12.2,1 -12.7,1 ; -10.66,1 -10.16,1 ; -10.16,0.5 -10.16,1 ; -10.16,1.5 -10.16,1 ; -9.66,1 -10.16,1 ; -8.12,1 -7.62,1 ; -7.62,0.5 -7.62,1 ; -7.62,1.5 -7.62,1 ; -7.12,1 -7.62,1 ; -5.58,1 -5.08,1 ; -5.08,0.5 -5.08,1 ; -5.08,1.5 -5.08,1 ; -4.58,1 -5.08,1 ; -0.5,0 0,0 ; 0,-0.5 0,0 ; 0,0.5 0,0 ; 0.5,0 0,0 ; 7.12,1 7.62,1 ; 7.62,0.5 7.62,1 ; 7.62,1.5 7.62,1 ; 8.12,1 7.62,1 ; 14.74,1 15.24,1 ; 15.24,0.5 15.24,1 ; 15.24,1.5 15.24,1 ; 15.74,1 15.24,1 ; 17.25,7.75 17.75,7.75 ; 17.75,7.25 17.75,7.75 ; 17.75,8.25 17.75,7.75 ; 18.25,7.75 17.75,7.75
Mechanical 14:
  lines w0.1: -22.25,-8 22.25,-8 22.25,8 -22.25,8 -22.25,-8
3D body "PWS_BELLNIX_OHV.stp": height 30.5, standoff -4.6, extent -22.25,-8 22.25,8

## PWS_CUI_PBK-1 [mm] "PBK-1 Series. Body 35x11mm, Height 27mm, Power Supply"
height 27
pads (6):
  round 1.9 hole 1.2: 1(-13.97,5.05) 3(-8.89,5.05) 5(-3.81,5.05) 7(1.27,5.05) 10(8.89,5.05) 12(13.97,5.05)
Top Overlay:
  lines w0.1: -15.157,5.5 -17.5,5.5 -17.5,1 -5.5,1 ; -12.783,5.5 -10.077,5.5 ; -7.703,5.5 -4.997,5.5 ; -2.623,5.5 0.083,5.5 ; 2.457,5.5 7.703,5.5 ; 10.077,5.5 12.783,5.5 ; 15.157,5.5 17.5,5.5 17.5,1 14.5,1 ; -5.5,1 -5.5,-5.5 9.456,-5.5 9.456,-4.5 14.5,-4.5 14.5,1 ; -5.5,1 14.5,1
Notvisible:
  lines w0.1: -14.47,5.05 -13.97,5.05 ; -13.97,4.55 -13.97,5.05 ; -13.97,5.55 -13.97,5.05 ; -13.47,5.05 -13.97,5.05 ; -9.39,5.05 -8.89,5.05 ; -8.89,4.55 -8.89,5.05 ; -8.89,5.55 -8.89,5.05 ; -8.39,5.05 -8.89,5.05 ; -4.31,5.05 -3.81,5.05 ; -3.81,4.55 -3.81,5.05 ; -3.81,5.55 -3.81,5.05 ; -3.31,5.05 -3.81,5.05 ; -0.5,0 0,0 ; 0,-0.5 0,0 ; 0,0.5 0,0 ; 0.5,0 0,0 ; 0.77,5.05 1.27,5.05 ; 1.27,4.55 1.27,5.05 ; 1.27,5.55 1.27,5.05 ; 1.77,5.05 1.27,5.05 ; 8.39,5.05 8.89,5.05 ; 8.89,4.55 8.89,5.05 ; 8.89,5.55 8.89,5.05 ; 9.39,5.05 8.89,5.05 ; 13.47,5.05 13.97,5.05 ; 13.97,4.55 13.97,5.05 ; 13.97,5.55 13.97,5.05 ; 14.47,5.05 13.97,5.05
Mechanical 14:
  lines w0.1: -5.5,1 -5.5,-5.5 9.456,-5.5 9.456,-4.5 14.5,-4.5 14.5,1 ; -17.5,1 17.5,1 17.5,5.5 -17.5,5.5 -17.5,1 ; -14.37,5.05 -13.97,5.05 -14.37,5.05
3D body "PWS_CUI_PBK-1.stp": height 27, standoff -3.6, extent -17.5,-5.5 17.5,5.5

## PWS_EMCO_CA-T [mm] "EMCO CA-T Series, High Performance, Precision Regulated, High-Voltage Power Supply , Body 45.72x28.45mm"
height 13.46
pads (9):
  round 2.3 hole 1.3: 1(-13.72,8.895) 2(5.33,2.545) 3(9.14,-10.155) 4(12.95,2.545) 5(19.3,-10.155) 6(19.3,2.545) 7(19.3,8.895) 8(-13.72,-10.155)
  round 1 hole 4.8 unplated mask+1.9: 9(0.76,3.305)
Top Layer keep-out:
  lines w1.27: -23.11,-14.475 23.11,-14.475 23.11,14.475 -23.11,14.475 -23.11,-14.475
Top Overlay:
  lines w0.2: 10.535,-14.475 10.535,-15.525 18.285,-15.525 18.285,-14.475 ; -23.11,-14.475 23.11,-14.475 23.11,14.475 -23.11,14.475 -23.11,-14.475
Notvisible:
  lines w0.1: -14.22,-10.155 -13.72,-10.155 ; -14.22,8.895 -13.72,8.895 ; -13.72,-10.655 -13.72,-10.155 ; -13.72,-9.655 -13.72,-10.155 ; -13.72,8.395 -13.72,8.895 ; -13.72,9.395 -13.72,8.895 ; -13.22,-10.155 -13.72,-10.155 ; -13.22,8.895 -13.72,8.895 ; -0.5,0 0,0 ; 0,-0.5 0,0 ; 0,0.5 0,0 ; 0.26,3.305 0.76,3.305 ; 0.5,0 0,0 ; 0.76,2.805 0.76,3.305 ; 0.76,3.805 0.76,3.305 ; 1.26,3.305 0.76,3.305 ; 4.83,2.545 5.33,2.545 ; 5.33,2.045 5.33,2.545 ; 5.33,3.045 5.33,2.545 ; 5.83,2.545 5.33,2.545 ; 8.64,-10.155 9.14,-10.155 ; 9.14,-10.655 9.14,-10.155 ; 9.14,-9.655 9.14,-10.155 ; 9.64,-10.155 9.14,-10.155 ; 12.45,2.545 12.95,2.545 ; 12.95,2.045 12.95,2.545 ; 12.95,3.045 12.95,2.545 ; 13.45,2.545 12.95,2.545 ; 18.8,-10.155 19.3,-10.155 ; 18.8,2.545 19.3,2.545 ; 18.8,8.895 19.3,8.895 ; 19.3,-10.655 19.3,-10.155 ; 19.3,-9.655 19.3,-10.155 ; 19.3,2.045 19.3,2.545 ; 19.3,3.045 19.3,2.545 ; 19.3,8.395 19.3,8.895 ; 19.3,9.395 19.3,8.895 ; 19.8,-10.155 19.3,-10.155 ; 19.8,2.545 19.3,2.545 ; 19.8,8.895 19.3,8.895
Mechanical 14:
  lines w0.1: 10.535,-14.475 10.535,-15.525 18.285,-15.525 18.285,-14.475 ; -23.11,-14.475 23.11,-14.475 23.11,14.475 -23.11,14.475 -23.11,-14.475
3D body "PWS_EMCO_CA-T.stp": height 13.46, standoff -3.6, extent -23.11,-15.525 23.11,14.475